# Altium footprint library Basal.PcbLib: 248 footprints (part 14 of 16)
Each footprint in its own frame and in the unit in brackets; x right, y up, seen from the top. Pads: shape width x height; smd on the part's side, far side on the other; paste and mask are expansions set on the pad; w line width, h text height; cw(c..) or ccw(c..) is an arc to the next point about the centre after c.
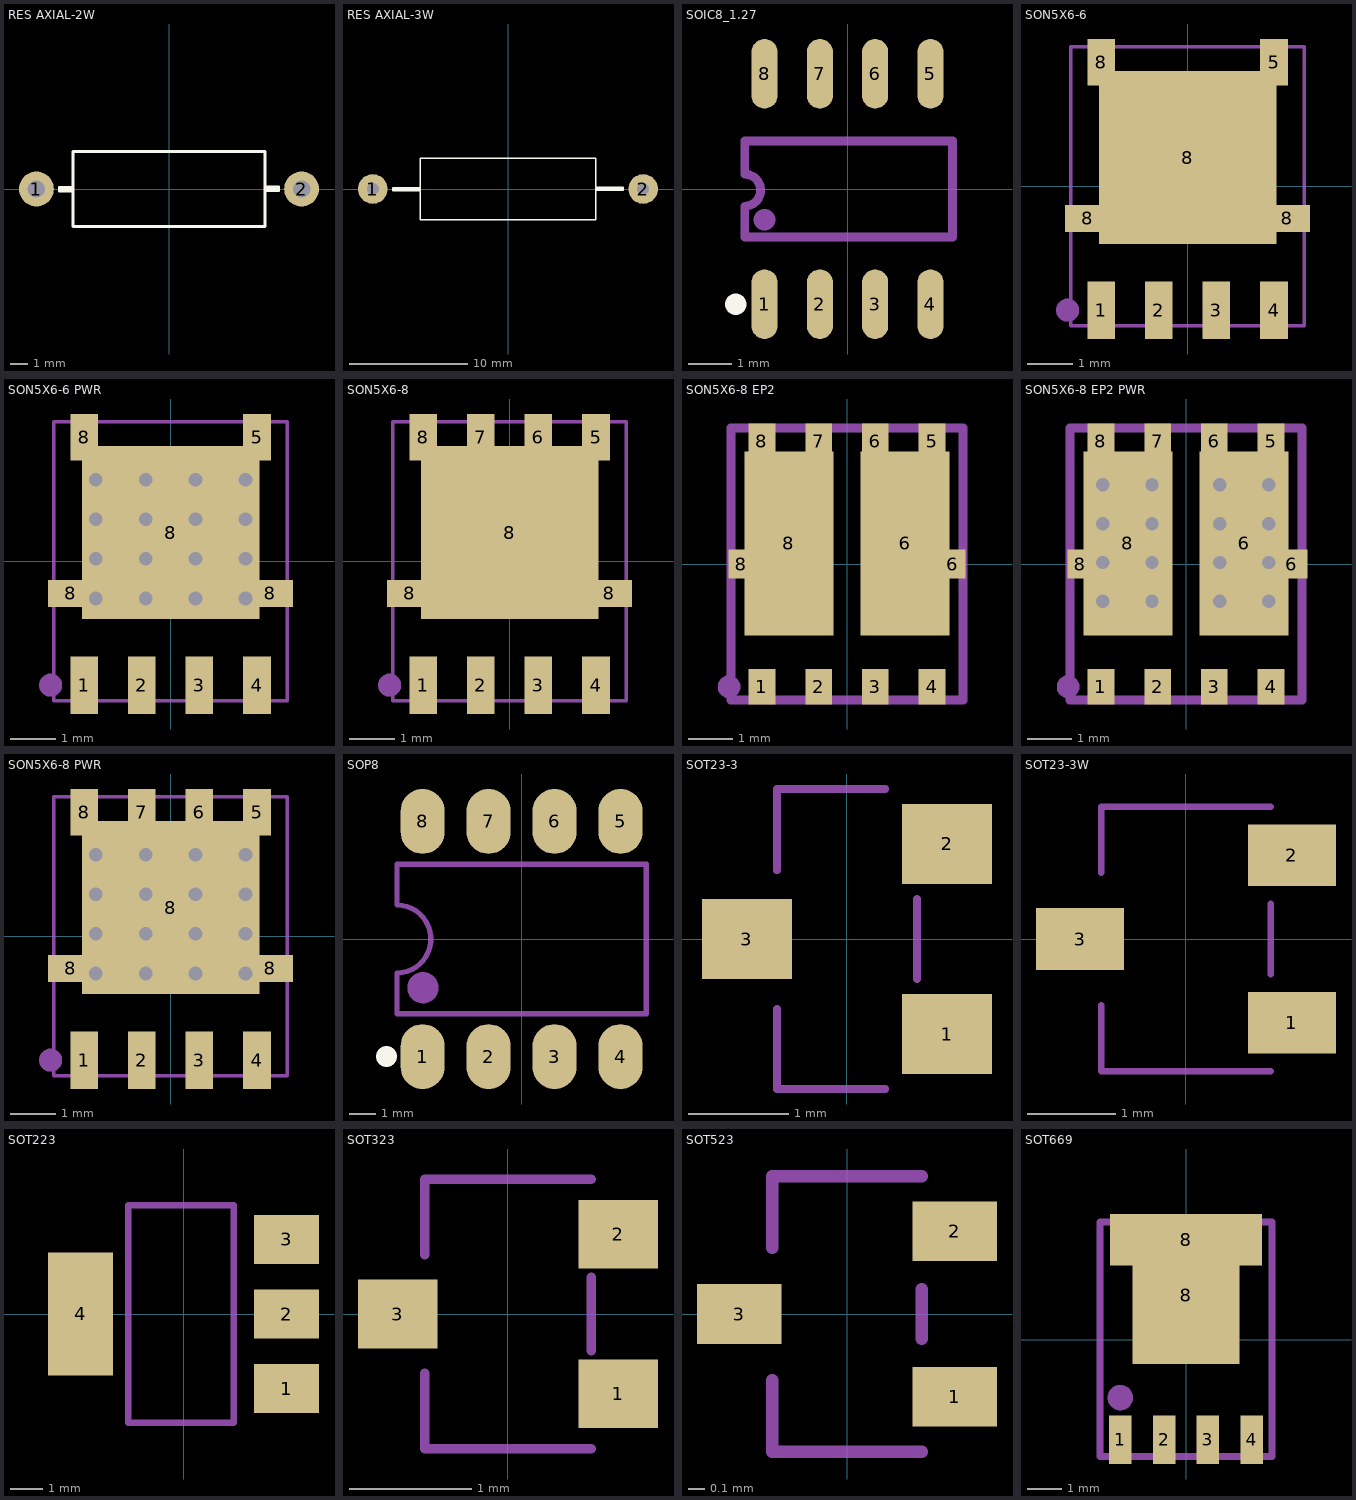
[diagram p13: the footprints below, top view; thin cyan lines are the x and y axes]

## RES AXIAL-2W [mm] "900mil间距M型直插电阻封装"
height 5.08
pads (2):
  round 2 hole 1: 1(-7.6,0) 2(7.6,0)
Top Overlay:
  lines w0.152: -6.299,0 -5.5,0 ; -5.5,-0.127 -6.299,-0.127 -6.299,0.102 -5.5,0.102 ; 5.5,-0.102 6.299,-0.102 6.299,0.127 5.5,0.127 ; 5.5,0 6.299,0 ; -5.5,-2.15 5.5,-2.15 5.5,2.15 -5.5,2.15 -5.5,-2.15
3D body "Resistor 2W.STEP": height 4.95, standoff -7.43, extent -8.02,-1.95 8.02,1.95

## RES AXIAL-3W [mm] "900mil间距M型直插电阻封装"
height 5.08
pads (2):
  round 2.5 hole 1: 1(-11.4,0) 2(11.4,0)
Top Overlay:
  lines w0.152: -9.711,0 -7.4,0 ; -7.4,-0.127 -9.711,-0.127 -9.711,0.102 -7.4,0.102 ; 7.4,-0.102 9.711,-0.102 9.711,0.127 7.4,0.127 ; 7.4,0 9.711,0 ; -7.4,-2.6 7.4,-2.6 7.4,2.6 -7.4,2.6 -7.4,-2.6
3D body "Resistor 3W.STEP": height 6.6, standoff -6.5, extent -11.83,-2.6 11.83,2.6

## SOIC8_1.27 [mm] "SOP, 8-Leads, Pitch 1.27mm"
pads (8):
  oval 0.6x1.6 smd: 1(-1.905,-2.645) 2(-0.635,-2.645) 3(0.635,-2.645) 4(1.905,-2.645) 5(1.905,2.645) 6(0.635,2.645) 7(-0.635,2.645) 8(-1.905,2.645)
Top Overlay:
  lines w0.5: -2.565,-2.645 -2.565,-2.644
Mechanical 15:
  lines w0.2: -2.362,0.339 cw(c-2.362,-0.027) -2.362,-0.394 -2.362,-1.1 2.413,-1.1 2.413,1.1 -2.362,1.1 -2.362,0.367
  lines w0.5: -1.905,-0.705 -1.905,-0.704
3D body "SOIC-8.STEP": height 1.75, standoff 0, extent -2.45,-3 2.45,3

## SON5X6-6 [mm]
pads (9):
  rect 0.61x1.27 smd: 1(-1.905,-2.732) 2(-0.635,-2.732) 3(0.635,-2.732) 4(1.905,-2.732)
  rect 0.61x1.02 smd: 5(1.905,2.733) 8(-1.905,2.733)
  rect 1x0.6 smd paste-2: 8(-2.2,-0.71) 8(2.2,-0.71)
  rect 3.91x3.81 smd paste-10: 8(0,0.628)
Top Paste:
  region: 1.372,1.626 1.372,2.464 0.178,2.464 0.178,1.626
  region: -0.178,0.754 -0.178,1.372 -1.422,1.372 -1.422,0.754
  region: -0.178,1.626 -0.178,2.464 -1.372,2.464 -1.372,1.626
  region: 1.422,0.754 1.422,1.372 0.178,1.372 0.178,0.754
  region: 0.622,-0.135 0.622,0.483 -0.622,0.483 -0.622,-0.135
Mechanical 15:
  circle w0.254: c-2.642,-2.732 r0.127
  lines w0.076: -2.576,-3.075 -2.576,3.075 2.576,3.075 2.576,-3.075 -2.576,-3.075
3D body "PowerPAK SO-8 (S).STEP": height 1.04, standoff 0, extent -2.575,-3.075 2.575,3.075

## SON5X6-6 PWR [mm]
pads (9):
  rect 0.61x1.27 smd: 1(-1.905,-2.732) 2(-0.635,-2.732) 3(0.635,-2.732) 4(1.905,-2.732)
  rect 0.61x1.02 smd: 5(1.905,2.733) 8(-1.905,2.733)
  rect 1x0.6 smd paste-2: 8(-2.2,-0.71) 8(2.2,-0.71)
  rect 3.91x3.81 smd paste-5: 8(0,0.628)
via 1.65,-0.823 diameter 0.6 hole 0.3
via 0.55,-0.823 diameter 0.6 hole 0.3
via -0.55,-0.823 diameter 0.6 hole 0.3
via 1.65,0.049 diameter 0.6 hole 0.3
via 0.55,0.049 diameter 0.6 hole 0.3
via -0.55,0.049 diameter 0.6 hole 0.3
via -1.65,0.049 diameter 0.6 hole 0.3
via 1.65,0.921 diameter 0.6 hole 0.3
via 0.55,0.921 diameter 0.6 hole 0.3
via -0.55,0.921 diameter 0.6 hole 0.3
via -1.65,0.921 diameter 0.6 hole 0.3
via 1.65,1.793 diameter 0.6 hole 0.3
via 0.55,1.793 diameter 0.6 hole 0.3
via -0.55,1.793 diameter 0.6 hole 0.3
via -1.65,1.793 diameter 0.6 hole 0.3
via -1.65,-0.823 diameter 0.6 hole 0.3
Top Paste:
  region: -0.178,0.754 -0.178,1.372 -1.422,1.372 -1.422,0.754
  region: 1.422,0.754 1.422,1.372 0.178,1.372 0.178,0.754
  region: 1.422,-0.135 1.422,0.483 0.178,0.483 0.178,-0.135
  region: -0.178,-0.135 -0.178,0.483 -1.422,0.483 -1.422,-0.135
  region: 0.622,-1.024 0.622,-0.406 -0.622,-0.406 -0.622,-1.024
  region: -0.178,1.626 -0.178,2.464 -1.372,2.464 -1.372,1.626
  region: 1.372,1.626 1.372,2.464 0.178,2.464 0.178,1.626
Mechanical 15:
  circle w0.254: c-2.642,-2.732 r0.127
  lines w0.076: -2.576,-3.075 2.576,-3.075 2.576,3.075 -2.576,3.075 -2.576,-3.075
3D body "PowerPAK SO-8 (S).STEP": height 1.04, standoff 0, extent -2.575,-3.075 2.575,3.075

## SON5X6-8 [mm]
pads (11):
  rect 0.61x1.27 smd: 1(-1.905,-2.732) 2(-0.635,-2.732) 3(0.635,-2.732) 4(1.905,-2.732)
  rect 0.61x1.02 smd: 5(1.905,2.733) 6(0.635,2.733) 7(-0.635,2.733) 8(-1.905,2.733)
  rect 1x0.6 smd paste-2: 8(-2.2,-0.71) 8(2.2,-0.71)
  rect 3.91x3.81 smd paste-2.54: 8(0,0.628)
Top Paste:
  region: 0.622,-0.135 0.622,0.483 -0.622,0.483 -0.622,-0.135
  region: 1.422,0.754 1.422,1.372 0.178,1.372 0.178,0.754
  region: -0.178,1.626 -0.178,2.464 -1.372,2.464 -1.372,1.626
  region: -0.178,0.754 -0.178,1.372 -1.422,1.372 -1.422,0.754
  region: 1.372,1.626 1.372,2.464 0.178,2.464 0.178,1.626
Mechanical 15:
  circle w0.254: c-2.642,-2.732 r0.127
  lines w0.076: -2.576,-3.075 -2.576,3.075 2.576,3.075 2.576,-3.075 -2.576,-3.075
3D body "PowerPAK SO-8 (S).STEP": height 1.04, standoff 0, extent -2.575,-3.075 2.575,3.075

## SON5X6-8 EP2 [mm]
pads (12):
  rect 0.6x0.8 smd: 1(-1.905,-2.75) 2(-0.635,-2.75) 3(0.635,-2.75) 4(1.905,-2.75) 5(1.905,2.75) 6(0.635,2.75) 7(-0.635,2.75) 8(-1.905,2.75)
  rect 2x4.12 smd paste-5: 6(1.3,0.46) 8(-1.3,0.46)
  rect 0.575x0.65 smd: 6(2.366,0) 8(-2.366,0)
Top Paste:
  region: 1.178,1.312 1.178,2.134 0.39,2.134 0.39,1.312
  region: 2.219,1.312 2.219,2.134 1.432,2.134 1.432,1.312
  region: 2.016,0.246 2.016,1.067 1.432,1.067 1.432,0.246
  region: 1.178,0.246 1.178,1.067 0.593,1.067 0.593,0.246
  region: 1.694,-0.821 1.694,0 0.906,0 0.906,-0.821
  region: -0.906,-0.821 -0.906,0 -1.694,0 -1.694,-0.821
  region: -1.422,0.246 -1.422,1.067 -2.007,1.067 -2.007,0.246
  region: -0.584,0.246 -0.584,1.067 -1.168,1.067 -1.168,0.246
  region: -0.381,1.312 -0.381,2.134 -1.168,2.134 -1.168,1.312
  region: -1.422,1.312 -1.422,2.134 -2.21,2.134 -2.21,1.312
Mechanical 15:
  circle w0.254: c-2.642,-2.75 r0.127
  lines w0.203: -2.6,-3.05 2.6,-3.05 2.6,3.05 -2.6,3.05 -2.6,-3.05
3D body "PQFN 5x6.STEP": height 0.9, standoff 0, extent -2.5,-3.01 2.5,3.01

## SON5X6-8 EP2 PWR [mm]
pads (12):
  rect 0.6x0.8 smd: 1(-1.905,-2.75) 2(-0.635,-2.75) 3(0.635,-2.75) 4(1.905,-2.75) 5(1.905,2.75) 6(0.635,2.75) 7(-0.635,2.75) 8(-1.905,2.75)
  rect 2x4.12 smd paste-5: 6(1.3,0.46) 8(-1.3,0.46)
  rect 0.7x0.65 smd: 6(2.366,0)
  rect 0.575x0.65 smd: 8(-2.366,0)
via -1.862,-0.838 diameter 0.6 hole 0.3
via -1.862,1.778 diameter 0.6 hole 0.3
via -0.762,1.778 diameter 0.6 hole 0.3
via 0.754,1.778 diameter 0.6 hole 0.3
via 1.854,1.778 diameter 0.6 hole 0.3
via -1.862,0.906 diameter 0.6 hole 0.3
via -0.762,0.906 diameter 0.6 hole 0.3
via 0.754,0.906 diameter 0.6 hole 0.3
via 1.854,0.906 diameter 0.6 hole 0.3
via -1.862,0.034 diameter 0.6 hole 0.3
via -0.762,0.034 diameter 0.6 hole 0.3
via 0.754,0.034 diameter 0.6 hole 0.3
via 1.854,0.034 diameter 0.6 hole 0.3
via -0.762,-0.838 diameter 0.6 hole 0.3
via 0.754,-0.838 diameter 0.6 hole 0.3
via 1.854,-0.838 diameter 0.6 hole 0.3
Top Paste:
  region: 1.178,1.312 1.178,2.134 0.39,2.134 0.39,1.312
  region: 2.219,1.312 2.219,2.134 1.432,2.134 1.432,1.312
  region: 2.016,0.246 2.016,1.067 1.432,1.067 1.432,0.246
  region: 1.178,0.246 1.178,1.067 0.593,1.067 0.593,0.246
  region: 1.694,-0.821 1.694,0 0.906,0 0.906,-0.821
  region: -0.906,-0.821 -0.906,0 -1.694,0 -1.694,-0.821
  region: -1.422,0.246 -1.422,1.067 -2.007,1.067 -2.007,0.246
  region: -0.584,0.246 -0.584,1.067 -1.168,1.067 -1.168,0.246
  region: -0.381,1.312 -0.381,2.134 -1.168,2.134 -1.168,1.312
  region: -1.422,1.312 -1.422,2.134 -2.21,2.134 -2.21,1.312
Mechanical 15:
  circle w0.254: c-2.642,-2.75 r0.127
  lines w0.203: -2.6,-3.05 2.6,-3.05 2.6,3.05 -2.6,3.05 -2.6,-3.05
3D body "PQFN 5x6.STEP": height 0.9, standoff 0, extent -2.5,-3.01 2.5,3.01

## SON5X6-8 PWR [mm]
pads (11):
  rect 0.61x1.27 smd: 1(-1.905,-2.732) 2(-0.635,-2.732) 3(0.635,-2.732) 4(1.905,-2.732)
  rect 0.61x1.02 smd: 5(1.905,2.733) 6(0.635,2.733) 7(-0.635,2.733) 8(-1.905,2.733)
  rect 1x0.6 smd paste-2: 8(-2.2,-0.71) 8(2.2,-0.71)
  rect 3.91x3.81 smd paste-5: 8(0,0.628)
via -1.65,-0.823 diameter 0.6 hole 0.3
via -1.65,1.793 diameter 0.6 hole 0.3
via -0.55,1.793 diameter 0.6 hole 0.3
via 0.55,1.793 diameter 0.6 hole 0.3
via 1.65,1.793 diameter 0.6 hole 0.3
via -1.65,0.921 diameter 0.6 hole 0.3
via -0.55,0.921 diameter 0.6 hole 0.3
via 0.55,0.921 diameter 0.6 hole 0.3
via 1.65,0.921 diameter 0.6 hole 0.3
via -1.65,0.049 diameter 0.6 hole 0.3
via -0.55,0.049 diameter 0.6 hole 0.3
via 0.55,0.049 diameter 0.6 hole 0.3
via 1.65,0.049 diameter 0.6 hole 0.3
via -0.55,-0.823 diameter 0.6 hole 0.3
via 0.55,-0.823 diameter 0.6 hole 0.3
via 1.65,-0.823 diameter 0.6 hole 0.3
Top Paste:
  region: -0.178,0.754 -0.178,1.372 -1.422,1.372 -1.422,0.754
  region: 1.422,0.754 1.422,1.372 0.178,1.372 0.178,0.754
  region: 1.422,-0.135 1.422,0.483 0.178,0.483 0.178,-0.135
  region: -0.178,-0.135 -0.178,0.483 -1.422,0.483 -1.422,-0.135
  region: 0.622,-1.024 0.622,-0.406 -0.622,-0.406 -0.622,-1.024
  region: -0.178,1.626 -0.178,2.464 -1.372,2.464 -1.372,1.626
  region: 1.372,1.626 1.372,2.464 0.178,2.464 0.178,1.626
Mechanical 15:
  circle w0.254: c-2.642,-2.732 r0.127
  lines w0.076: -2.576,-3.075 -2.576,3.075 2.576,3.075 2.576,-3.075 -2.576,-3.075
3D body "PowerPAK SO-8 (S).STEP": height 1.04, standoff 0, extent -2.575,-3.075 2.575,3.075

## SOP8 [mm] "SOP, 8-Leads, Body 9.6x6.7mm (max), Pitch 2.54mm, IPC Medium Density"
height 4.85
pads (8):
  oval 1.7x2.5 smd: 1(-3.81,-4.525) 2(-1.27,-4.525) 3(1.27,-4.525) 4(3.81,-4.525) 5(3.81,4.525) 6(1.27,4.525) 7(-1.27,4.525) 8(-3.81,4.525)
Top Overlay:
  lines w0.8: -5.199,-4.525 -5.199,-4.525
Mechanical 15:
  circle w0.6: c-3.8,-1.875 r0.3
  lines w0.2: -4.8,-2.875 -4.8,-1.308 ccw(c-4.8,0) -4.8,1.308 -4.8,2.875 4.8,2.875 4.8,-2.875 -4.8,-2.875
3D body "SMD8.STEP": height 5.08, standoff 0, extent -4.955,-5.15 4.955,5.15

## SOT23-3 [mm] "贴片MOS的SOT-23封装"
pads (3):
  rect 0.9x0.8 smd: 1(1,-0.95) 2(1,0.95) 3(-1,0)
Mechanical 15:
  lines w0.076: -0.7,-0.7 -0.7,-1.5 0.381,-1.5 ; -0.7,0.687 -0.7,1.5 0.381,1.5 ; 0.7,-0.4 0.7,0.4
3D body "SOT23-3.STEP": height 1.09, standoff 0, extent -1.25,-1.5 1.25,1.5

## SOT23-3W [mm] "贴片MOS的SOT-23封装"
pads (3):
  rect 1x0.7 smd: 1(1.2,-0.95) 2(1.2,0.95) 3(-1.2,0)
Mechanical 15:
  lines w0.076: -0.96,-0.75 -0.96,-1.5 0.96,-1.5 ; -0.96,0.75 -0.96,1.5 0.96,1.5 ; 0.96,-0.4 0.96,0.4
3D body "SOT23.STEP": height 1.3, standoff 0, extent -1.5,-1.5 1.5,1.5

## SOT223 [mm]
pads (4):
  rect 2x1.5 smd: 1(3.179,-2.3) 2(3.179,0) 3(3.179,2.3)
  rect 2x3.8 smd: 4(-3.179,0)
Mechanical 15:
  lines w0.2: -1.704,-3.35 -1.704,3.35 1.546,3.35 1.546,-3.35 -1.704,-3.35
3D body "SOT223-4.STEP": height 1.64, standoff -0.01, extent -3.37,-3.256 3.63,3.244

## SOT323 [mm]
pads (3):
  rect 0.65x0.56 smd: 1(0.9,-0.65) 2(0.9,0.65) 3(-0.9,0)
Mechanical 15:
  lines w0.076: -0.68,-0.483 -0.68,-1.1 0.68,-1.1 ; -0.68,0.483 -0.68,1.1 0.68,1.1 ; 0.68,-0.3 0.68,0.3
3D body "SOT-323(sc70-3).STEP": height 1, standoff 0, extent -1.15,-1.05 1.15,1.05

## SOT523 [mm]
pads (3):
  rect 0.51x0.36 smd: 1(0.65,-0.5) 2(0.65,0.5) 3(-0.65,0)
Mechanical 15:
  lines w0.076: -0.45,-0.4 -0.45,-0.83 0.45,-0.83 ; -0.45,0.4 -0.45,0.83 0.45,0.83 ; 0.45,-0.15 0.45,0.15
3D body "SOT-523.STEP": height 0.8, standoff 0, extent -0.8,-0.8 0.8,0.8

## SOT669 [mm] "SOP, 8-Leads, Pitch 1.27mm"
pads (6):
  rect 0.65x1.4 smd: 1(-1.905,-2.9) 2(-0.635,-2.9) 3(0.635,-2.9) 4(1.905,-2.9)
  rect 3.1x4 smd: 8(0,1.3)
  rect 4.4x1.5 smd: 8(0,2.9)
Mechanical 15:
  circle w0.381: c-1.905,-1.676 r0.178
  lines w0.203: -2.5,-3.388 -2.5,3.412 2.5,3.412 2.5,-3.388 -2.5,-3.388
3D body "SOT669.STEP": height 1.2, standoff 0, extent -2.5,-3.372 2.5,3.395